# Altium schematic symbol library jlcpcb_2025_04_inductors_extended_0402.schlib: 1396 symbols (part 2 of 8) (continued)
## HBLS1005-R12J
designator L?  Inductance: 120nH
Inductor, 120nH, ±5%, 2.8Ω, 150mA, SMD 0402; Manufacturer: HYHONGYEX; Manufacturer Part Number: HBLS1005-R12J; Self-Resonant Frequency: 600MHz; Q Factor: 8@100MHz; Package Size: 0402; JLCPCB Basic Part: No; JLCPCB Part Number: C964010; Supplier 1: LCSC; Category: Inductors; Supplier Part Number 1: C964010; Tolerance: ±5%; Rated Current: 150mA; DC Resistance: 2.8Ω; RoHS: Yes; ComponentLink1Description: Datasheet; ComponentLink1URL: https://wmsc.lcsc.com/wmsc/upload/file/pdf/v2/lcsc/2012171917_HYHONGYEX-HBLS1005-R12J_C964010.pdf; ComponentLink2Description: JLCPCB Part URL; ComponentLink2URL: https://jlcpcb.com/partdetail/C964010; ComponentLink3Description: LCSC Part URL; ComponentLink3URL: https://lcsc.com/product-detail/Inductors-SMD_HYHONGYEX-HYHONGYEX-HBLS1005-R12J_C964010.html
footprint IND-0402 (0402 (1005M) Inductor)
pins: 1, 2

## HBLS1005-R15J
designator L?  Inductance: 150nH
Inductor, 150nH, ±5%, 3.2Ω, 100mA, SMD 0402; Manufacturer: HYHONGYEX; Manufacturer Part Number: HBLS1005-R15J; Self-Resonant Frequency: 550MHz; Q Factor: 8@100MHz; Package Size: 0402; JLCPCB Basic Part: No; JLCPCB Part Number: C964011; Supplier 1: LCSC; Category: Inductors; Supplier Part Number 1: C964011; Tolerance: ±5%; Rated Current: 100mA; DC Resistance: 3.2Ω; RoHS: Yes; ComponentLink1Description: Datasheet; ComponentLink1URL: https://wmsc.lcsc.com/wmsc/upload/file/pdf/v2/lcsc/2012171917_HYHONGYEX-HBLS1005-R15J_C964011.pdf; ComponentLink2Description: JLCPCB Part URL; ComponentLink2URL: https://jlcpcb.com/partdetail/C964011; ComponentLink3Description: LCSC Part URL; ComponentLink3URL: https://lcsc.com/product-detail/Inductors-SMD_HYHONGYEX-HYHONGYEX-HBLS1005-R15J_C964011.html
footprint IND-0402 (0402 (1005M) Inductor)
pins: 1, 2

## HBLS1005-R22J
designator L?  Inductance: 220nH
Inductor, 220nH, ±5%, 4Ω, 100mA, SMD 0402; Manufacturer: HYHONGYEX; Manufacturer Part Number: HBLS1005-R22J; Self-Resonant Frequency: 450MHz; Q Factor: 8@100MHz; Package Size: 0402; JLCPCB Basic Part: No; JLCPCB Part Number: C964013; Supplier 1: LCSC; Category: Inductors; Supplier Part Number 1: C964013; Tolerance: ±5%; Rated Current: 100mA; DC Resistance: 4Ω; RoHS: Yes; ComponentLink1Description: Datasheet; ComponentLink1URL: https://wmsc.lcsc.com/wmsc/upload/file/pdf/v2/lcsc/2201131330_HYHONGYEX-HBLS1005-R22J_C964013.pdf; ComponentLink2Description: JLCPCB Part URL; ComponentLink2URL: https://jlcpcb.com/partdetail/C964013; ComponentLink3Description: LCSC Part URL; ComponentLink3URL: https://lcsc.com/product-detail/Inductors-SMD_HYHONGYEX-HYHONGYEX-HBLS1005-R22J_C964013.html
footprint IND-0402 (0402 (1005M) Inductor)
pins: 1, 2

## HCI1005LF-1N5S
designator L?  Inductance: 1.5nH
Inductor, 1.5nH, 100mΩ, 300mA, SMD 0402; Manufacturer: TAI-TECH; Manufacturer Part Number: HCI1005LF-1N5S; Package Size: 0402; JLCPCB Basic Part: No; JLCPCB Part Number: C127312; Supplier 1: LCSC; Category: Inductors; Supplier Part Number 1: C127312; Rated Current: 300mA; DC Resistance: 100mΩ; RoHS: Yes; ComponentLink1Description: Datasheet; ComponentLink1URL: https://wmsc.lcsc.com/wmsc/upload/file/pdf/v2/lcsc/2009171134_TAI-TECH-HCI1005LF-1N5S_C127312.pdf; ComponentLink2Description: JLCPCB Part URL; ComponentLink2URL: https://jlcpcb.com/partdetail/C127312; ComponentLink3Description: LCSC Part URL; ComponentLink3URL: https://lcsc.com/product-detail/Inductors-SMD_TAI-TECH-TAI-TECH-HCI1005LF-1N5S_C127312.html
footprint IND-0402 (0402 (1005M) Inductor)
pins: 1, 2

## HCI1005LF-2N7S
designator L?  Inductance: 2.7nH
Inductor, 2.7nH, 200mΩ, 300mA, SMD 0402; Manufacturer: TAI-TECH; Manufacturer Part Number: HCI1005LF-2N7S; Package Size: 0402; JLCPCB Basic Part: No; JLCPCB Part Number: C127299; Supplier 1: LCSC; Category: Inductors; Supplier Part Number 1: C127299; Rated Current: 300mA; DC Resistance: 200mΩ; RoHS: Yes; ComponentLink1Description: Datasheet; ComponentLink1URL: https://wmsc.lcsc.com/wmsc/upload/file/pdf/v2/lcsc/2009171134_TAI-TECH-HCI1005LF-2N7S_C127299.pdf; ComponentLink2Description: JLCPCB Part URL; ComponentLink2URL: https://jlcpcb.com/partdetail/C127299; ComponentLink3Description: LCSC Part URL; ComponentLink3URL: https://lcsc.com/product-detail/Inductors-SMD_TAI-TECH-TAI-TECH-HCI1005LF-2N7S_C127299.html
footprint IND-0402 (0402 (1005M) Inductor)
pins: 1, 2

## HCI1005LF-4N7S
designator L?  Inductance: 4.7nH
Inductor, 4.7nH, 200mΩ, 300mA, SMD 0402; Manufacturer: TAI-TECH; Manufacturer Part Number: HCI1005LF-4N7S; Package Size: 0402; JLCPCB Basic Part: No; JLCPCB Part Number: C127297; Supplier 1: LCSC; Category: Inductors; Supplier Part Number 1: C127297; Rated Current: 300mA; DC Resistance: 200mΩ; RoHS: Yes; ComponentLink1Description: Datasheet; ComponentLink1URL: https://wmsc.lcsc.com/wmsc/upload/file/pdf/v2/lcsc/2009171134_TAI-TECH-HCI1005LF-4N7S_C127297.pdf; ComponentLink2Description: JLCPCB Part URL; ComponentLink2URL: https://jlcpcb.com/partdetail/C127297; ComponentLink3Description: LCSC Part URL; ComponentLink3URL: https://lcsc.com/product-detail/Inductors-SMD_TAI-TECH-TAI-TECH-HCI1005LF-4N7S_C127297.html
footprint IND-0402 (0402 (1005M) Inductor)
pins: 1, 2

## HCI1005LF-4N7S-MS8
designator L?  Inductance: 4.7nH
Inductor, 4.7nH, 200mΩ, 300mA, SMD 0402; Manufacturer: TAI-TECH; Manufacturer Part Number: HCI1005LF-4N7S-MS8; Package Size: 0402; JLCPCB Basic Part: No; JLCPCB Part Number: C304335; Supplier 1: LCSC; Category: Inductors; Supplier Part Number 1: C304335; Rated Current: 300mA; DC Resistance: 200mΩ; RoHS: Yes; ComponentLink1Description: Datasheet; ComponentLink1URL: https://wmsc.lcsc.com/wmsc/upload/file/pdf/v2/lcsc/2009171411_TAI-TECH-HCI1005LF-4N7S-MS8_C304335.pdf; ComponentLink2Description: JLCPCB Part URL; ComponentLink2URL: https://jlcpcb.com/partdetail/C304335; ComponentLink3Description: LCSC Part URL; ComponentLink3URL: https://lcsc.com/product-detail/Inductors-SMD_TAI-TECH-TAI-TECH-HCI1005LF-4N7S-MS8_C304335.html
footprint IND-0402 (0402 (1005M) Inductor)
pins: 1, 2

## HCI1005LF-12NJ
designator L?  Inductance: 12nH
Inductor, 12nH, ±5%, 500mΩ, 300mA, SMD 0402; Manufacturer: TAI-TECH; Manufacturer Part Number: HCI1005LF-12NJ; Package Size: 0402; JLCPCB Basic Part: No; JLCPCB Part Number: C127305; Supplier 1: LCSC; Category: Inductors; Supplier Part Number 1: C127305; Tolerance: ±5%; Rated Current: 300mA; DC Resistance: 500mΩ; RoHS: Yes; ComponentLink1Description: Datasheet; ComponentLink1URL: https://wmsc.lcsc.com/wmsc/upload/file/pdf/v2/lcsc/2009171134_TAI-TECH-HCI1005LF-12NJ_C127305.pdf; ComponentLink2Description: JLCPCB Part URL; ComponentLink2URL: https://jlcpcb.com/partdetail/C127305; ComponentLink3Description: LCSC Part URL; ComponentLink3URL: https://lcsc.com/product-detail/Inductors-SMD_TAI-TECH-TAI-TECH-HCI1005LF-12NJ_C127305.html
footprint IND-0402 (0402 (1005M) Inductor)
pins: 1, 2

## HCI1005LF-15NJ
designator L?  Inductance: 15nH
Inductor, 15nH, ±5%, 500mΩ, 300mA, SMD 0402; Manufacturer: TAI-TECH; Manufacturer Part Number: HCI1005LF-15NJ; Package Size: 0402; JLCPCB Basic Part: No; JLCPCB Part Number: C127298; Supplier 1: LCSC; Category: Inductors; Supplier Part Number 1: C127298; Tolerance: ±5%; Rated Current: 300mA; DC Resistance: 500mΩ; RoHS: Yes; ComponentLink1Description: Datasheet; ComponentLink1URL: https://wmsc.lcsc.com/wmsc/upload/file/pdf/v2/lcsc/2009171134_TAI-TECH-HCI1005LF-15NJ_C127298.pdf; ComponentLink2Description: JLCPCB Part URL; ComponentLink2URL: https://jlcpcb.com/partdetail/C127298; ComponentLink3Description: LCSC Part URL; ComponentLink3URL: https://lcsc.com/product-detail/Inductors-SMD_TAI-TECH-TAI-TECH-HCI1005LF-15NJ_C127298.html
footprint IND-0402 (0402 (1005M) Inductor)
pins: 1, 2

## HCI1005LF-39NJ
designator L?  Inductance: 39nH
Inductor, 39nH, ±5%, 1Ω, 200mA, SMD 0402; Manufacturer: TAI-TECH; Manufacturer Part Number: HCI1005LF-39NJ; Package Size: 0402; JLCPCB Basic Part: No; JLCPCB Part Number: C127304; Supplier 1: LCSC; Category: Inductors; Supplier Part Number 1: C127304; Tolerance: ±5%; Rated Current: 200mA; DC Resistance: 1Ω; RoHS: Yes; ComponentLink1Description: Datasheet; ComponentLink1URL: https://wmsc.lcsc.com/wmsc/upload/file/pdf/v2/lcsc/2009171134_TAI-TECH-HCI1005LF-39NJ_C127304.pdf; ComponentLink2Description: JLCPCB Part URL; ComponentLink2URL: https://jlcpcb.com/partdetail/C127304; ComponentLink3Description: LCSC Part URL; ComponentLink3URL: https://lcsc.com/product-detail/Inductors-SMD_TAI-TECH-TAI-TECH-HCI1005LF-39NJ_C127304.html
footprint IND-0402 (0402 (1005M) Inductor)
pins: 1, 2

## HK1005R10J-T
designator L?  Inductance: 100nH
Inductor, 100nH, ±5%, 1.5Ω, 200mA, SMD 0402; Manufacturer: Taiyo Yuden; Manufacturer Part Number: HK1005R10J-T; Q Factor: 8@100MHz; Package Size: 0402; JLCPCB Basic Part: No; JLCPCB Part Number: C87196; Supplier 1: LCSC; Category: Inductors; Supplier Part Number 1: C87196; Tolerance: ±5%; Rated Current: 200mA; DC Resistance: 1.5Ω; RoHS: Yes; ComponentLink1Description: Datasheet; ComponentLink1URL: https://wmsc.lcsc.com/wmsc/upload/file/pdf/v2/lcsc/2304140030_Taiyo-Yuden-HK1005R10J-T_C87196.pdf; ComponentLink2Description: JLCPCB Part URL; ComponentLink2URL: https://jlcpcb.com/partdetail/C87196; ComponentLink3Description: LCSC Part URL; ComponentLink3URL: https://lcsc.com/product-detail/Inductors-SMD_Taiyo-Yuden-Taiyo-Yuden-HK1005R10J-T_C87196.html
footprint IND-0402 (0402 (1005M) Inductor)
pins: 1, 2

## HK10051N5S-T
designator L?  Inductance: 1.5nH
Inductor, 1.5nH, 100mΩ, 850mA, SMD 0402; Manufacturer: Taiyo Yuden; Manufacturer Part Number: HK10051N5S-T; Self-Resonant Frequency: 100MHz; Q Factor: 8@100MHz; Package Size: 0402; JLCPCB Basic Part: No; JLCPCB Part Number: C87175; Supplier 1: LCSC; Category: Inductors; Supplier Part Number 1: C87175; Rated Current: 850mA; DC Resistance: 100mΩ; RoHS: Yes; ComponentLink1Description: Datasheet; ComponentLink1URL: https://wmsc.lcsc.com/wmsc/upload/file/pdf/v2/lcsc/2304140030_Taiyo-Yuden-HK10051N5S-T_C87175.pdf; ComponentLink2Description: JLCPCB Part URL; ComponentLink2URL: https://jlcpcb.com/partdetail/C87175; ComponentLink3Description: LCSC Part URL; ComponentLink3URL: https://lcsc.com/product-detail/Inductors-SMD_Taiyo-Yuden-Taiyo-Yuden-HK10051N5S-T_C87175.html
footprint IND-0402 (0402 (1005M) Inductor)
pins: 1, 2

## HK10053N6S-T
designator L?  Inductance: 3.6nH
Inductor, 3.6nH, 200mΩ, 500mA, SMD 0402; Manufacturer: Taiyo Yuden; Manufacturer Part Number: HK10053N6S-T; Self-Resonant Frequency: 100MHz; Q Factor: 8@100MHz; Package Size: 0402; JLCPCB Basic Part: No; JLCPCB Part Number: C89160; Supplier 1: LCSC; Category: Inductors; Supplier Part Number 1: C89160; Rated Current: 500mA; DC Resistance: 200mΩ; RoHS: Yes; ComponentLink1Description: Datasheet; ComponentLink1URL: https://wmsc.lcsc.com/wmsc/upload/file/pdf/v2/lcsc/2304140030_Taiyo-Yuden-HK10053N6S-T_C89160.pdf; ComponentLink2Description: JLCPCB Part URL; ComponentLink2URL: https://jlcpcb.com/partdetail/C89160; ComponentLink3Description: LCSC Part URL; ComponentLink3URL: https://lcsc.com/product-detail/Inductors-SMD_Taiyo-Yuden-Taiyo-Yuden-HK10053N6S-T_C89160.html
footprint IND-0402 (0402 (1005M) Inductor)
pins: 1, 2

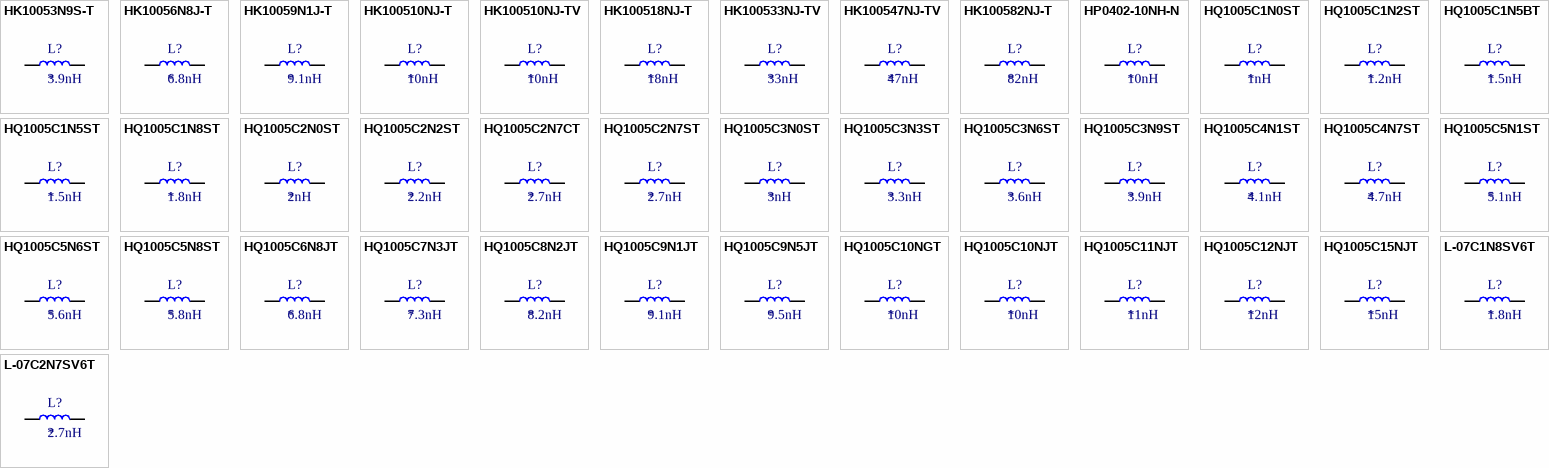
[diagram p6: symbols HK10053N9S-T to L-07C2N7SV6T]

## HK10053N9S-T
designator L?  Inductance: 3.9nH
Inductor, 3.9nH, 210mΩ, 500mA, SMD 0402; Manufacturer: Taiyo Yuden; Manufacturer Part Number: HK10053N9S-T; Package Size: 0402; JLCPCB Basic Part: No; JLCPCB Part Number: C87180; Supplier 1: LCSC; Category: Inductors; Supplier Part Number 1: C87180; Rated Current: 500mA; DC Resistance: 210mΩ; RoHS: Yes; ComponentLink1Description: Datasheet; ComponentLink1URL: https://wmsc.lcsc.com/wmsc/upload/file/pdf/v2/lcsc/2304140030_Taiyo-Yuden-HK10053N9S-T_C87180.pdf; ComponentLink2Description: JLCPCB Part URL; ComponentLink2URL: https://jlcpcb.com/partdetail/C87180; ComponentLink3Description: LCSC Part URL; ComponentLink3URL: https://lcsc.com/product-detail/Inductors-SMD_Taiyo-Yuden-Taiyo-Yuden-HK10053N9S-T_C87180.html
footprint IND-0402 (0402 (1005M) Inductor)
pins: 1, 2

## HK10056N8J-T
designator L?  Inductance: 6.8nH
Inductor, 6.8nH, ±5%, 250mΩ, 430mA, SMD 0402; Manufacturer: Taiyo Yuden; Manufacturer Part Number: HK10056N8J-T; Q Factor: 8@100MHz; Package Size: 0402; JLCPCB Basic Part: No; JLCPCB Part Number: C87184; Supplier 1: LCSC; Category: Inductors; Supplier Part Number 1: C87184; Tolerance: ±5%; Rated Current: 430mA; DC Resistance: 250mΩ; RoHS: Yes; ComponentLink1Description: Datasheet; ComponentLink1URL: https://wmsc.lcsc.com/wmsc/upload/file/pdf/v2/lcsc/2304140030_Taiyo-Yuden-HK10056N8J-T_C87184.pdf; ComponentLink2Description: JLCPCB Part URL; ComponentLink2URL: https://jlcpcb.com/partdetail/C87184; ComponentLink3Description: LCSC Part URL; ComponentLink3URL: https://lcsc.com/product-detail/Inductors-SMD_Taiyo-Yuden-Taiyo-Yuden-HK10056N8J-T_C87184.html
footprint IND-0402 (0402 (1005M) Inductor)
pins: 1, 2

## HK10059N1J-T
designator L?  Inductance: 9.1nH
Inductor, 9.1nH, ±5%, 300mΩ, 360mA, SMD 0402; Manufacturer: Taiyo Yuden; Manufacturer Part Number: HK10059N1J-T; Q Factor: 8@100MHz; Package Size: 0402; JLCPCB Basic Part: No; JLCPCB Part Number: C87186; Supplier 1: LCSC; Category: Inductors; Supplier Part Number 1: C87186; Tolerance: ±5%; Rated Current: 360mA; DC Resistance: 300mΩ; RoHS: Yes; ComponentLink1Description: Datasheet; ComponentLink1URL: https://wmsc.lcsc.com/wmsc/upload/file/pdf/v2/lcsc/2304140030_Taiyo-Yuden-HK10059N1J-T_C87186.pdf; ComponentLink2Description: JLCPCB Part URL; ComponentLink2URL: https://jlcpcb.com/partdetail/C87186; ComponentLink3Description: LCSC Part URL; ComponentLink3URL: https://lcsc.com/product-detail/Inductors-SMD_Taiyo-Yuden-Taiyo-Yuden-HK10059N1J-T_C87186.html
footprint IND-0402 (0402 (1005M) Inductor)
pins: 1, 2

## HK100510NJ-T
designator L?  Inductance: 10nH
Inductor, 10nH, ±5%, 310mΩ, 340mA, SMD 0402; Manufacturer: Taiyo Yuden; Manufacturer Part Number: HK100510NJ-T; Q Factor: 8@100MHz; Package Size: 0402; JLCPCB Basic Part: No; JLCPCB Part Number: C87187; Supplier 1: LCSC; Category: Inductors; Supplier Part Number 1: C87187; Tolerance: ±5%; Rated Current: 340mA; DC Resistance: 310mΩ; RoHS: Yes; ComponentLink1Description: Datasheet; ComponentLink1URL: https://wmsc.lcsc.com/wmsc/upload/file/pdf/v2/lcsc/2304140030_Taiyo-Yuden-HK100510NJ-T_C87187.pdf; ComponentLink2Description: JLCPCB Part URL; ComponentLink2URL: https://jlcpcb.com/partdetail/C87187; ComponentLink3Description: LCSC Part URL; ComponentLink3URL: https://lcsc.com/product-detail/Inductors-SMD_Taiyo-Yuden-Taiyo-Yuden-HK100510NJ-T_C87187.html
footprint IND-0402 (0402 (1005M) Inductor)
pins: 1, 2

## HK100510NJ-TV
designator L?  Inductance: 10nH
Inductor, 10nH, ±5%, 310mΩ, 300mA, SMD 0402; Manufacturer: Taiyo Yuden; Manufacturer Part Number: HK100510NJ-TV; Self-Resonant Frequency: 3.2GHz; Q Factor: 8@100MHz; Package Size: 0402; JLCPCB Basic Part: No; JLCPCB Part Number: C2046086; Supplier 1: LCSC; Category: Inductors; Supplier Part Number 1: C2046086; Tolerance: ±5%; Rated Current: 300mA; DC Resistance: 310mΩ; RoHS: Yes; ComponentLink1Description: Datasheet; ComponentLink1URL: https://wmsc.lcsc.com/wmsc/upload/file/pdf/v2/lcsc/2404231147_Taiyo-Yuden-HK100510NJ-TV_C2046086.pdf; ComponentLink2Description: JLCPCB Part URL; ComponentLink2URL: https://jlcpcb.com/partdetail/C2046086; ComponentLink3Description: LCSC Part URL; ComponentLink3URL: https://lcsc.com/product-detail/Inductors-SMD_Taiyo-Yuden-Taiyo-Yuden-HK100510NJ-TV_C2046086.html
footprint IND-0402 (0402 (1005M) Inductor)
pins: 1, 2

## HK100518NJ-T
designator L?  Inductance: 18nH
Inductor, 18nH, ±5%, 550mΩ, 310mA, SMD 0402; Manufacturer: Taiyo Yuden; Manufacturer Part Number: HK100518NJ-T; Q Factor: 8@100MHz; Package Size: 0402; JLCPCB Basic Part: No; JLCPCB Part Number: C87190; Supplier 1: LCSC; Category: Inductors; Supplier Part Number 1: C87190; Tolerance: ±5%; Rated Current: 310mA; DC Resistance: 550mΩ; RoHS: Yes; ComponentLink1Description: Datasheet; ComponentLink1URL: https://wmsc.lcsc.com/wmsc/upload/file/pdf/v2/lcsc/2304140030_Taiyo-Yuden-HK100518NJ-T_C87190.pdf; ComponentLink2Description: JLCPCB Part URL; ComponentLink2URL: https://jlcpcb.com/partdetail/C87190; ComponentLink3Description: LCSC Part URL; ComponentLink3URL: https://lcsc.com/product-detail/Inductors-SMD_Taiyo-Yuden-Taiyo-Yuden-HK100518NJ-T_C87190.html
footprint IND-0402 (0402 (1005M) Inductor)
pins: 1, 2

## HK100533NJ-TV
designator L?  Inductance: 33nH
Inductor, 33nH, ±5%, 500mΩ, 200mA, SMD 0402; Manufacturer: Taiyo Yuden; Manufacturer Part Number: HK100533NJ-TV; Self-Resonant Frequency: 1.3GHz; Q Factor: 8@100MHz; Package Size: 0402; JLCPCB Basic Part: No; JLCPCB Part Number: C515379; Supplier 1: LCSC; Category: Inductors; Supplier Part Number 1: C515379; Tolerance: ±5%; Rated Current: 200mA; DC Resistance: 500mΩ; RoHS: Yes; ComponentLink1Description: Datasheet; ComponentLink1URL: https://wmsc.lcsc.com/wmsc/upload/file/pdf/v2/lcsc/2304140030_Taiyo-Yuden-HK100533NJ-TV_C515379.pdf; ComponentLink2Description: JLCPCB Part URL; ComponentLink2URL: https://jlcpcb.com/partdetail/C515379; ComponentLink3Description: LCSC Part URL; ComponentLink3URL: https://lcsc.com/product-detail/Inductors-SMD_Taiyo-Yuden-Taiyo-Yuden-HK100533NJ-TV_C515379.html
footprint IND-0402 (0402 (1005M) Inductor)
pins: 1, 2

## HK100547NJ-TV
designator L?  Inductance: 47nH
Inductor, 47nH, ±5%, 580mΩ, 200mA, SMD 0402; Manufacturer: Taiyo Yuden; Manufacturer Part Number: HK100547NJ-TV; Self-Resonant Frequency: 1GHz; Q Factor: 8@100MHz; Package Size: 0402; JLCPCB Basic Part: No; JLCPCB Part Number: C515373; Supplier 1: LCSC; Category: Inductors; Supplier Part Number 1: C515373; Tolerance: ±5%; Rated Current: 200mA; DC Resistance: 580mΩ; RoHS: Yes; ComponentLink1Description: Datasheet; ComponentLink1URL: https://wmsc.lcsc.com/wmsc/upload/file/pdf/v2/lcsc/2304140030_Taiyo-Yuden-HK100547NJ-TV_C515373.pdf; ComponentLink2Description: JLCPCB Part URL; ComponentLink2URL: https://jlcpcb.com/partdetail/C515373; ComponentLink3Description: LCSC Part URL; ComponentLink3URL: https://lcsc.com/product-detail/Inductors-SMD_Taiyo-Yuden-Taiyo-Yuden-HK100547NJ-TV_C515373.html
footprint IND-0402 (0402 (1005M) Inductor)
pins: 1, 2

## HK100582NJ-T
designator L?  Inductance: 82nH
Inductor, 82nH, ±5%, 1.3Ω, 200mA, SMD 0402; Manufacturer: Taiyo Yuden; Manufacturer Part Number: HK100582NJ-T; Q Factor: 8@100MHz; Package Size: 0402; JLCPCB Basic Part: No; JLCPCB Part Number: C89165; Supplier 1: LCSC; Category: Inductors; Supplier Part Number 1: C89165; Tolerance: ±5%; Rated Current: 200mA; DC Resistance: 1.3Ω; RoHS: Yes; ComponentLink1Description: Datasheet; ComponentLink1URL: https://wmsc.lcsc.com/wmsc/upload/file/pdf/v2/lcsc/2304140030_Taiyo-Yuden-HK100582NJ-T_C89165.pdf; ComponentLink2Description: JLCPCB Part URL; ComponentLink2URL: https://jlcpcb.com/partdetail/C89165; ComponentLink3Description: LCSC Part URL; ComponentLink3URL: https://lcsc.com/product-detail/Inductors-SMD_Taiyo-Yuden-Taiyo-Yuden-HK100582NJ-T_C89165.html
footprint IND-0402 (0402 (1005M) Inductor)
pins: 1, 2

## HP0402-10NH-N
designator L?  Inductance: 10nH
Inductor, 10nH, ±3%, SMD 0402; Manufacturer: Chilisin Elec; Manufacturer Part Number: HP0402-10NH-N; Package Size: 0402; JLCPCB Basic Part: No; JLCPCB Part Number: C285911; Supplier 1: LCSC; Category: Inductors; Supplier Part Number 1: C285911; Tolerance: ±3%; RoHS: Yes; ComponentLink1Description: Datasheet; ComponentLink1URL: https://wmsc.lcsc.com/wmsc/upload/file/pdf/v2/lcsc/2304140030_Chilisin-Elec-HP0402-10NH-N_C285911.pdf; ComponentLink2Description: JLCPCB Part URL; ComponentLink2URL: https://jlcpcb.com/partdetail/C285911; ComponentLink3Description: LCSC Part URL; ComponentLink3URL: https://lcsc.com/product-detail/Inductors-SMD_Chilisin-Elec-Chilisin-Elec-HP0402-10NH-N_C285911.html
footprint IND-0402 (0402 (1005M) Inductor)
pins: 1, 2

## HQ1005C1N0ST
designator L?  Inductance: 1nH
Inductor, 1nH, 50mΩ, 1A, SMD 0402; Manufacturer: Sunlord; Manufacturer Part Number: HQ1005C1N0ST; Package Size: 0402; JLCPCB Basic Part: No; JLCPCB Part Number: C145019; Supplier 1: LCSC; Category: Inductors; Supplier Part Number 1: C145019; Rated Current: 1A; DC Resistance: 50mΩ; RoHS: Yes; ComponentLink1Description: Datasheet; ComponentLink1URL: https://wmsc.lcsc.com/wmsc/upload/file/pdf/v2/lcsc/2110081330_Sunlord-HQ1005C1N0ST_C145019.pdf; ComponentLink2Description: JLCPCB Part URL; ComponentLink2URL: https://jlcpcb.com/partdetail/C145019; ComponentLink3Description: LCSC Part URL; ComponentLink3URL: https://lcsc.com/product-detail/Inductors-SMD_Sunlord-Sunlord-HQ1005C1N0ST_C145019.html
footprint IND-0402 (0402 (1005M) Inductor)
pins: 1, 2

## HQ1005C1N2ST
designator L?  Inductance: 1.2nH
Inductor, 1.2nH, 50mΩ, 1A, SMD 0402; Manufacturer: Sunlord; Manufacturer Part Number: HQ1005C1N2ST; Package Size: 0402; JLCPCB Basic Part: No; JLCPCB Part Number: C145020; Supplier 1: LCSC; Category: Inductors; Supplier Part Number 1: C145020; Rated Current: 1A; DC Resistance: 50mΩ; RoHS: Yes; ComponentLink1Description: Datasheet; ComponentLink1URL: https://wmsc.lcsc.com/wmsc/upload/file/pdf/v2/lcsc/2110081330_Sunlord-HQ1005C1N2ST_C145020.pdf; ComponentLink2Description: JLCPCB Part URL; ComponentLink2URL: https://jlcpcb.com/partdetail/C145020; ComponentLink3Description: LCSC Part URL; ComponentLink3URL: https://lcsc.com/product-detail/Inductors-SMD_Sunlord-Sunlord-HQ1005C1N2ST_C145020.html
footprint IND-0402 (0402 (1005M) Inductor)
pins: 1, 2

## HQ1005C1N5BT
designator L?  Inductance: 1.5nH
Inductor, 1.5nH, SMD 0402; Manufacturer: Sunlord; Manufacturer Part Number: HQ1005C1N5BT; Package Size: 0402; JLCPCB Basic Part: No; JLCPCB Part Number: C2988087; Supplier 1: LCSC; Category: Inductors; Supplier Part Number 1: C2988087; RoHS: Yes; ComponentLink1Description: Datasheet; ComponentLink1URL: https://wmsc.lcsc.com/wmsc/upload/file/pdf/v2/lcsc/2203311630_Sunlord-HQ1005C1N5BT_C2988087.pdf; ComponentLink2Description: JLCPCB Part URL; ComponentLink2URL: https://jlcpcb.com/partdetail/C2988087; ComponentLink3Description: LCSC Part URL; ComponentLink3URL: https://lcsc.com/product-detail/Inductors-SMD_Sunlord-Sunlord-HQ1005C1N5BT_C2988087.html
footprint IND-0402 (0402 (1005M) Inductor)
pins: 1, 2

## HQ1005C1N5ST
designator L?  Inductance: 1.5nH
Inductor, 1.5nH, 50mΩ, 1A, SMD 0402; Manufacturer: Sunlord; Manufacturer Part Number: HQ1005C1N5ST; Package Size: 0402; JLCPCB Basic Part: No; JLCPCB Part Number: C145021; Supplier 1: LCSC; Category: Inductors; Supplier Part Number 1: C145021; Rated Current: 1A; DC Resistance: 50mΩ; RoHS: Yes; ComponentLink1Description: Datasheet; ComponentLink1URL: https://wmsc.lcsc.com/wmsc/upload/file/pdf/v2/lcsc/2110081330_Sunlord-HQ1005C1N5ST_C145021.pdf; ComponentLink2Description: JLCPCB Part URL; ComponentLink2URL: https://jlcpcb.com/partdetail/C145021; ComponentLink3Description: LCSC Part URL; ComponentLink3URL: https://lcsc.com/product-detail/Inductors-SMD_Sunlord-Sunlord-HQ1005C1N5ST_C145021.html
footprint IND-0402 (0402 (1005M) Inductor)
pins: 1, 2

## HQ1005C1N8ST
designator L?  Inductance: 1.8nH
Inductor, 1.8nH, 70mΩ, 800mA, SMD 0402; Manufacturer: Sunlord; Manufacturer Part Number: HQ1005C1N8ST; Package Size: 0402; JLCPCB Basic Part: No; JLCPCB Part Number: C145022; Supplier 1: LCSC; Category: Inductors; Supplier Part Number 1: C145022; Rated Current: 800mA; DC Resistance: 70mΩ; RoHS: Yes; ComponentLink1Description: Datasheet; ComponentLink1URL: https://wmsc.lcsc.com/wmsc/upload/file/pdf/v2/lcsc/2110081330_Sunlord-HQ1005C1N8ST_C145022.pdf; ComponentLink2Description: JLCPCB Part URL; ComponentLink2URL: https://jlcpcb.com/partdetail/C145022; ComponentLink3Description: LCSC Part URL; ComponentLink3URL: https://lcsc.com/product-detail/Inductors-SMD_Sunlord-Sunlord-HQ1005C1N8ST_C145022.html
footprint IND-0402 (0402 (1005M) Inductor)
pins: 1, 2

## HQ1005C2N0ST
designator L?  Inductance: 2nH
Inductor, 2nH, 70mΩ, 800mA, SMD 0402; Manufacturer: Sunlord; Manufacturer Part Number: HQ1005C2N0ST; Package Size: 0402; JLCPCB Basic Part: No; JLCPCB Part Number: C145023; Supplier 1: LCSC; Category: Inductors; Supplier Part Number 1: C145023; Rated Current: 800mA; DC Resistance: 70mΩ; RoHS: Yes; ComponentLink1Description: Datasheet; ComponentLink1URL: https://wmsc.lcsc.com/wmsc/upload/file/pdf/v2/lcsc/2110081330_Sunlord-HQ1005C2N0ST_C145023.pdf; ComponentLink2Description: JLCPCB Part URL; ComponentLink2URL: https://jlcpcb.com/partdetail/C145023; ComponentLink3Description: LCSC Part URL; ComponentLink3URL: https://lcsc.com/product-detail/Inductors-SMD_Sunlord-Sunlord-HQ1005C2N0ST_C145023.html
footprint IND-0402 (0402 (1005M) Inductor)
pins: 1, 2

## HQ1005C2N2ST
designator L?  Inductance: 2.2nH
Inductor, 2.2nH, 70mΩ, 800mA, SMD 0402; Manufacturer: Sunlord; Manufacturer Part Number: HQ1005C2N2ST; Package Size: 0402; JLCPCB Basic Part: No; JLCPCB Part Number: C145024; Supplier 1: LCSC; Category: Inductors; Supplier Part Number 1: C145024; Rated Current: 800mA; DC Resistance: 70mΩ; RoHS: Yes; ComponentLink1Description: Datasheet; ComponentLink1URL: https://wmsc.lcsc.com/wmsc/upload/file/pdf/v2/lcsc/2110081330_Sunlord-HQ1005C2N2ST_C145024.pdf; ComponentLink2Description: JLCPCB Part URL; ComponentLink2URL: https://jlcpcb.com/partdetail/C145024; ComponentLink3Description: LCSC Part URL; ComponentLink3URL: https://lcsc.com/product-detail/Inductors-SMD_Sunlord-Sunlord-HQ1005C2N2ST_C145024.html
footprint IND-0402 (0402 (1005M) Inductor)
pins: 1, 2

## HQ1005C2N7CT
designator L?  Inductance: 2.7nH
Inductor, 2.7nH, 90mΩ, 700mA, SMD 0402; Manufacturer: Sunlord; Manufacturer Part Number: HQ1005C2N7CT; Package Size: 0402; JLCPCB Basic Part: No; JLCPCB Part Number: C43370; Supplier 1: LCSC; Category: Inductors; Supplier Part Number 1: C43370; Rated Current: 700mA; DC Resistance: 90mΩ; RoHS: Yes; ComponentLink1Description: Datasheet; ComponentLink1URL: https://wmsc.lcsc.com/wmsc/upload/file/pdf/v2/lcsc/2110081230_Sunlord-HQ1005C2N7CT_C43370.pdf; ComponentLink2Description: JLCPCB Part URL; ComponentLink2URL: https://jlcpcb.com/partdetail/C43370; ComponentLink3Description: LCSC Part URL; ComponentLink3URL: https://lcsc.com/product-detail/Inductors-SMD_Sunlord-Sunlord-HQ1005C2N7CT_C43370.html
footprint IND-0402 (0402 (1005M) Inductor)
pins: 1, 2

## HQ1005C2N7ST
designator L?  Inductance: 2.7nH
Inductor, 2.7nH, 90mΩ, 700mA, SMD 0402; Manufacturer: Sunlord; Manufacturer Part Number: HQ1005C2N7ST; Package Size: 0402; JLCPCB Basic Part: No; JLCPCB Part Number: C145027; Supplier 1: LCSC; Category: Inductors; Supplier Part Number 1: C145027; Rated Current: 700mA; DC Resistance: 90mΩ; RoHS: Yes; ComponentLink1Description: Datasheet; ComponentLink1URL: https://wmsc.lcsc.com/wmsc/upload/file/pdf/v2/lcsc/2110081330_Sunlord-HQ1005C2N7ST_C145027.pdf; ComponentLink2Description: JLCPCB Part URL; ComponentLink2URL: https://jlcpcb.com/partdetail/C145027; ComponentLink3Description: LCSC Part URL; ComponentLink3URL: https://lcsc.com/product-detail/Inductors-SMD_Sunlord-Sunlord-HQ1005C2N7ST_C145027.html
footprint IND-0402 (0402 (1005M) Inductor)
pins: 1, 2

## HQ1005C3N0ST
designator L?  Inductance: 3nH
Inductor, 3nH, 90mΩ, 700mA, SMD 0402; Manufacturer: Sunlord; Manufacturer Part Number: HQ1005C3N0ST; Package Size: 0402; JLCPCB Basic Part: No; JLCPCB Part Number: C145029; Supplier 1: LCSC; Category: Inductors; Supplier Part Number 1: C145029; Rated Current: 700mA; DC Resistance: 90mΩ; RoHS: Yes; ComponentLink1Description: Datasheet; ComponentLink1URL: https://wmsc.lcsc.com/wmsc/upload/file/pdf/v2/lcsc/2110081330_Sunlord-HQ1005C3N0ST_C145029.pdf; ComponentLink2Description: JLCPCB Part URL; ComponentLink2URL: https://jlcpcb.com/partdetail/C145029; ComponentLink3Description: LCSC Part URL; ComponentLink3URL: https://lcsc.com/product-detail/Inductors-SMD_Sunlord-Sunlord-HQ1005C3N0ST_C145029.html
footprint IND-0402 (0402 (1005M) Inductor)
pins: 1, 2

## HQ1005C3N3ST
designator L?  Inductance: 3.3nH
Inductor, 3.3nH, 90mΩ, 700mA, SMD 0402; Manufacturer: Sunlord; Manufacturer Part Number: HQ1005C3N3ST; Package Size: 0402; JLCPCB Basic Part: No; JLCPCB Part Number: C145030; Supplier 1: LCSC; Category: Inductors; Supplier Part Number 1: C145030; Rated Current: 700mA; DC Resistance: 90mΩ; RoHS: Yes; ComponentLink1Description: Datasheet; ComponentLink1URL: https://wmsc.lcsc.com/wmsc/upload/file/pdf/v2/lcsc/2110081330_Sunlord-HQ1005C3N3ST_C145030.pdf; ComponentLink2Description: JLCPCB Part URL; ComponentLink2URL: https://jlcpcb.com/partdetail/C145030; ComponentLink3Description: LCSC Part URL; ComponentLink3URL: https://lcsc.com/product-detail/Inductors-SMD_Sunlord-Sunlord-HQ1005C3N3ST_C145030.html
footprint IND-0402 (0402 (1005M) Inductor)
pins: 1, 2

## HQ1005C3N6ST
designator L?  Inductance: 3.6nH
Inductor, 3.6nH, 100mΩ, 700mA, SMD 0402; Manufacturer: Sunlord; Manufacturer Part Number: HQ1005C3N6ST; Package Size: 0402; JLCPCB Basic Part: No; JLCPCB Part Number: C145031; Supplier 1: LCSC; Category: Inductors; Supplier Part Number 1: C145031; Rated Current: 700mA; DC Resistance: 100mΩ; RoHS: Yes; ComponentLink1Description: Datasheet; ComponentLink1URL: https://wmsc.lcsc.com/wmsc/upload/file/pdf/v2/lcsc/2110081330_Sunlord-HQ1005C3N6ST_C145031.pdf; ComponentLink2Description: JLCPCB Part URL; ComponentLink2URL: https://jlcpcb.com/partdetail/C145031; ComponentLink3Description: LCSC Part URL; ComponentLink3URL: https://lcsc.com/product-detail/Inductors-SMD_Sunlord-Sunlord-HQ1005C3N6ST_C145031.html
footprint IND-0402 (0402 (1005M) Inductor)
pins: 1, 2

## HQ1005C3N9ST
designator L?  Inductance: 3.9nH
Inductor, 3.9nH, 100mΩ, 700mA, SMD 0402; Manufacturer: Sunlord; Manufacturer Part Number: HQ1005C3N9ST; Package Size: 0402; JLCPCB Basic Part: No; JLCPCB Part Number: C145032; Supplier 1: LCSC; Category: Inductors; Supplier Part Number 1: C145032; Rated Current: 700mA; DC Resistance: 100mΩ; RoHS: Yes; ComponentLink1Description: Datasheet; ComponentLink1URL: https://wmsc.lcsc.com/wmsc/upload/file/pdf/v2/lcsc/2110081330_Sunlord-HQ1005C3N9ST_C145032.pdf; ComponentLink2Description: JLCPCB Part URL; ComponentLink2URL: https://jlcpcb.com/partdetail/C145032; ComponentLink3Description: LCSC Part URL; ComponentLink3URL: https://lcsc.com/product-detail/Inductors-SMD_Sunlord-Sunlord-HQ1005C3N9ST_C145032.html
footprint IND-0402 (0402 (1005M) Inductor)
pins: 1, 2

## HQ1005C4N1ST
designator L?  Inductance: 4.1nH
Inductor, 4.1nH, 120mΩ, 650mA, SMD 0402; Manufacturer: Sunlord; Manufacturer Part Number: HQ1005C4N1ST; Package Size: 0402; JLCPCB Basic Part: No; JLCPCB Part Number: C145033; Supplier 1: LCSC; Category: Inductors; Supplier Part Number 1: C145033; Rated Current: 650mA; DC Resistance: 120mΩ; RoHS: Yes; ComponentLink1Description: Datasheet; ComponentLink1URL: https://wmsc.lcsc.com/wmsc/upload/file/pdf/v2/lcsc/2110081330_Sunlord-HQ1005C4N1ST_C145033.pdf; ComponentLink2Description: JLCPCB Part URL; ComponentLink2URL: https://jlcpcb.com/partdetail/C145033; ComponentLink3Description: LCSC Part URL; ComponentLink3URL: https://lcsc.com/product-detail/Inductors-SMD_Sunlord-Sunlord-HQ1005C4N1ST_C145033.html
footprint IND-0402 (0402 (1005M) Inductor)
pins: 1, 2

## HQ1005C4N7ST
designator L?  Inductance: 4.7nH
Inductor, 4.7nH, 130mΩ, 600mA, SMD 0402; Manufacturer: Sunlord; Manufacturer Part Number: HQ1005C4N7ST; Package Size: 0402; JLCPCB Basic Part: No; JLCPCB Part Number: C145035; Supplier 1: LCSC; Category: Inductors; Supplier Part Number 1: C145035; Rated Current: 600mA; DC Resistance: 130mΩ; RoHS: Yes; ComponentLink1Description: Datasheet; ComponentLink1URL: https://wmsc.lcsc.com/wmsc/upload/file/pdf/v2/lcsc/2110081330_Sunlord-HQ1005C4N7ST_C145035.pdf; ComponentLink2Description: JLCPCB Part URL; ComponentLink2URL: https://jlcpcb.com/partdetail/C145035; ComponentLink3Description: LCSC Part URL; ComponentLink3URL: https://lcsc.com/product-detail/Inductors-SMD_Sunlord-Sunlord-HQ1005C4N7ST_C145035.html
footprint IND-0402 (0402 (1005M) Inductor)
pins: 1, 2

## HQ1005C5N1ST
designator L?  Inductance: 5.1nH
Inductor, 5.1nH, 130mΩ, 600mA, SMD 0402; Manufacturer: Sunlord; Manufacturer Part Number: HQ1005C5N1ST; Package Size: 0402; JLCPCB Basic Part: No; JLCPCB Part Number: C145036; Supplier 1: LCSC; Category: Inductors; Supplier Part Number 1: C145036; Rated Current: 600mA; DC Resistance: 130mΩ; RoHS: Yes; ComponentLink1Description: Datasheet; ComponentLink1URL: https://wmsc.lcsc.com/wmsc/upload/file/pdf/v2/lcsc/2110081330_Sunlord-HQ1005C5N1ST_C145036.pdf; ComponentLink2Description: JLCPCB Part URL; ComponentLink2URL: https://jlcpcb.com/partdetail/C145036; ComponentLink3Description: LCSC Part URL; ComponentLink3URL: https://lcsc.com/product-detail/Inductors-SMD_Sunlord-Sunlord-HQ1005C5N1ST_C145036.html
footprint IND-0402 (0402 (1005M) Inductor)
pins: 1, 2

## HQ1005C5N6ST
designator L?  Inductance: 5.6nH
Inductor, 5.6nH, 130mΩ, 600mA, SMD 0402; Manufacturer: Sunlord; Manufacturer Part Number: HQ1005C5N6ST; Package Size: 0402; JLCPCB Basic Part: No; JLCPCB Part Number: C145037; Supplier 1: LCSC; Category: Inductors; Supplier Part Number 1: C145037; Rated Current: 600mA; DC Resistance: 130mΩ; RoHS: Yes; ComponentLink1Description: Datasheet; ComponentLink1URL: https://wmsc.lcsc.com/wmsc/upload/file/pdf/v2/lcsc/2110081330_Sunlord-HQ1005C5N6ST_C145037.pdf; ComponentLink2Description: JLCPCB Part URL; ComponentLink2URL: https://jlcpcb.com/partdetail/C145037; ComponentLink3Description: LCSC Part URL; ComponentLink3URL: https://lcsc.com/product-detail/Inductors-SMD_Sunlord-Sunlord-HQ1005C5N6ST_C145037.html
footprint IND-0402 (0402 (1005M) Inductor)
pins: 1, 2

## HQ1005C5N8ST
designator L?  Inductance: 5.8nH
Inductor, 5.8nH, 130mΩ, 600mA, SMD 0402; Manufacturer: Sunlord; Manufacturer Part Number: HQ1005C5N8ST; Package Size: 0402; JLCPCB Basic Part: No; JLCPCB Part Number: C145038; Supplier 1: LCSC; Category: Inductors; Supplier Part Number 1: C145038; Rated Current: 600mA; DC Resistance: 130mΩ; RoHS: Yes; ComponentLink1Description: Datasheet; ComponentLink1URL: https://wmsc.lcsc.com/wmsc/upload/file/pdf/v2/lcsc/2110081330_Sunlord-HQ1005C5N8ST_C145038.pdf; ComponentLink2Description: JLCPCB Part URL; ComponentLink2URL: https://jlcpcb.com/partdetail/C145038; ComponentLink3Description: LCSC Part URL; ComponentLink3URL: https://lcsc.com/product-detail/Inductors-SMD_Sunlord-Sunlord-HQ1005C5N8ST_C145038.html
footprint IND-0402 (0402 (1005M) Inductor)
pins: 1, 2

## HQ1005C6N8JT
designator L?  Inductance: 6.8nH
Inductor, 6.8nH, ±5%, 150mΩ, 550mA, SMD 0402; Manufacturer: Sunlord; Manufacturer Part Number: HQ1005C6N8JT; Package Size: 0402; JLCPCB Basic Part: No; JLCPCB Part Number: C145040; Supplier 1: LCSC; Category: Inductors; Supplier Part Number 1: C145040; Tolerance: ±5%; Rated Current: 550mA; DC Resistance: 150mΩ; RoHS: Yes; ComponentLink1Description: Datasheet; ComponentLink1URL: https://wmsc.lcsc.com/wmsc/upload/file/pdf/v2/lcsc/2110081330_Sunlord-HQ1005C6N8JT_C145040.pdf; ComponentLink2Description: JLCPCB Part URL; ComponentLink2URL: https://jlcpcb.com/partdetail/C145040; ComponentLink3Description: LCSC Part URL; ComponentLink3URL: https://lcsc.com/product-detail/Inductors-SMD_Sunlord-Sunlord-HQ1005C6N8JT_C145040.html
footprint IND-0402 (0402 (1005M) Inductor)
pins: 1, 2

## HQ1005C7N3JT
designator L?  Inductance: 7.3nH
Inductor, 7.3nH, ±5%, 160mΩ, 550mA, SMD 0402; Manufacturer: Sunlord; Manufacturer Part Number: HQ1005C7N3JT; Package Size: 0402; JLCPCB Basic Part: No; JLCPCB Part Number: C145041; Supplier 1: LCSC; Category: Inductors; Supplier Part Number 1: C145041; Tolerance: ±5%; Rated Current: 550mA; DC Resistance: 160mΩ; RoHS: Yes; ComponentLink1Description: Datasheet; ComponentLink1URL: https://wmsc.lcsc.com/wmsc/upload/file/pdf/v2/lcsc/2110081330_Sunlord-HQ1005C7N3JT_C145041.pdf; ComponentLink2Description: JLCPCB Part URL; ComponentLink2URL: https://jlcpcb.com/partdetail/C145041; ComponentLink3Description: LCSC Part URL; ComponentLink3URL: https://lcsc.com/product-detail/Inductors-SMD_Sunlord-Sunlord-HQ1005C7N3JT_C145041.html
footprint IND-0402 (0402 (1005M) Inductor)
pins: 1, 2

## HQ1005C8N2JT
designator L?  Inductance: 8.2nH
Inductor, 8.2nH, ±5%, 160mΩ, 550mA, SMD 0402; Manufacturer: Sunlord; Manufacturer Part Number: HQ1005C8N2JT; Package Size: 0402; JLCPCB Basic Part: No; JLCPCB Part Number: C145043; Supplier 1: LCSC; Category: Inductors; Supplier Part Number 1: C145043; Tolerance: ±5%; Rated Current: 550mA; DC Resistance: 160mΩ; RoHS: Yes; ComponentLink1Description: Datasheet; ComponentLink1URL: https://wmsc.lcsc.com/wmsc/upload/file/pdf/v2/lcsc/2110081330_Sunlord-HQ1005C8N2JT_C145043.pdf; ComponentLink2Description: JLCPCB Part URL; ComponentLink2URL: https://jlcpcb.com/partdetail/C145043; ComponentLink3Description: LCSC Part URL; ComponentLink3URL: https://lcsc.com/product-detail/Inductors-SMD_Sunlord-Sunlord-HQ1005C8N2JT_C145043.html
footprint IND-0402 (0402 (1005M) Inductor)
pins: 1, 2

## HQ1005C9N1JT
designator L?  Inductance: 9.1nH
Inductor, 9.1nH, ±5%, 180mΩ, 500mA, SMD 0402; Manufacturer: Sunlord; Manufacturer Part Number: HQ1005C9N1JT; Package Size: 0402; JLCPCB Basic Part: No; JLCPCB Part Number: C145045; Supplier 1: LCSC; Category: Inductors; Supplier Part Number 1: C145045; Tolerance: ±5%; Rated Current: 500mA; DC Resistance: 180mΩ; RoHS: Yes; ComponentLink1Description: Datasheet; ComponentLink1URL: https://wmsc.lcsc.com/wmsc/upload/file/pdf/v2/lcsc/2110081330_Sunlord-HQ1005C9N1JT_C145045.pdf; ComponentLink2Description: JLCPCB Part URL; ComponentLink2URL: https://jlcpcb.com/partdetail/C145045; ComponentLink3Description: LCSC Part URL; ComponentLink3URL: https://lcsc.com/product-detail/Inductors-SMD_Sunlord-Sunlord-HQ1005C9N1JT_C145045.html
footprint IND-0402 (0402 (1005M) Inductor)
pins: 1, 2

## HQ1005C9N5JT
designator L?  Inductance: 9.5nH
Inductor, 9.5nH, ±5%, 180mΩ, 500mA, SMD 0402; Manufacturer: Sunlord; Manufacturer Part Number: HQ1005C9N5JT; Package Size: 0402; JLCPCB Basic Part: No; JLCPCB Part Number: C145046; Supplier 1: LCSC; Category: Inductors; Supplier Part Number 1: C145046; Tolerance: ±5%; Rated Current: 500mA; DC Resistance: 180mΩ; RoHS: Yes; ComponentLink1Description: Datasheet; ComponentLink1URL: https://wmsc.lcsc.com/wmsc/upload/file/pdf/v2/lcsc/2110081330_Sunlord-HQ1005C9N5JT_C145046.pdf; ComponentLink2Description: JLCPCB Part URL; ComponentLink2URL: https://jlcpcb.com/partdetail/C145046; ComponentLink3Description: LCSC Part URL; ComponentLink3URL: https://lcsc.com/product-detail/Inductors-SMD_Sunlord-Sunlord-HQ1005C9N5JT_C145046.html
footprint IND-0402 (0402 (1005M) Inductor)
pins: 1, 2

## HQ1005C10NGT
designator L?  Inductance: 10nH
Inductor, 10nH, SMD 0402; Manufacturer: Sunlord; Manufacturer Part Number: HQ1005C10NGT; Package Size: 0402; JLCPCB Basic Part: No; JLCPCB Part Number: C2991779; Supplier 1: LCSC; Category: Inductors; Supplier Part Number 1: C2991779; RoHS: Yes; ComponentLink1Description: Datasheet; ComponentLink1URL: https://wmsc.lcsc.com/wmsc/upload/file/pdf/v2/lcsc/2204082130_Sunlord-HQ1005C10NGT_C2991779.pdf; ComponentLink2Description: JLCPCB Part URL; ComponentLink2URL: https://jlcpcb.com/partdetail/C2991779; ComponentLink3Description: LCSC Part URL; ComponentLink3URL: https://lcsc.com/product-detail/Inductors-SMD_Sunlord-Sunlord-HQ1005C10NGT_C2991779.html
footprint IND-0402 (0402 (1005M) Inductor)
pins: 1, 2

## HQ1005C10NJT
designator L?  Inductance: 10nH
Inductor, 10nH, ±5%, 180mΩ, 500mA, SMD 0402; Manufacturer: Sunlord; Manufacturer Part Number: HQ1005C10NJT; Package Size: 0402; JLCPCB Basic Part: No; JLCPCB Part Number: C145047; Supplier 1: LCSC; Category: Inductors; Supplier Part Number 1: C145047; Tolerance: ±5%; Rated Current: 500mA; DC Resistance: 180mΩ; RoHS: Yes; ComponentLink1Description: Datasheet; ComponentLink1URL: https://wmsc.lcsc.com/wmsc/upload/file/pdf/v2/lcsc/2109161530_Sunlord-HQ1005C10NJT_C145047.pdf; ComponentLink2Description: JLCPCB Part URL; ComponentLink2URL: https://jlcpcb.com/partdetail/C145047; ComponentLink3Description: LCSC Part URL; ComponentLink3URL: https://lcsc.com/product-detail/Inductors-SMD_Sunlord-Sunlord-HQ1005C10NJT_C145047.html
footprint IND-0402 (0402 (1005M) Inductor)
pins: 1, 2

## HQ1005C11NJT
designator L?  Inductance: 11nH
Inductor, 11nH, ±5%, 200mΩ, 500mA, SMD 0402; Manufacturer: Sunlord; Manufacturer Part Number: HQ1005C11NJT; Package Size: 0402; JLCPCB Basic Part: No; JLCPCB Part Number: C145048; Supplier 1: LCSC; Category: Inductors; Supplier Part Number 1: C145048; Tolerance: ±5%; Rated Current: 500mA; DC Resistance: 200mΩ; RoHS: Yes; ComponentLink1Description: Datasheet; ComponentLink1URL: https://wmsc.lcsc.com/wmsc/upload/file/pdf/v2/lcsc/2110081330_Sunlord-HQ1005C11NJT_C145048.pdf; ComponentLink2Description: JLCPCB Part URL; ComponentLink2URL: https://jlcpcb.com/partdetail/C145048; ComponentLink3Description: LCSC Part URL; ComponentLink3URL: https://lcsc.com/product-detail/Inductors-SMD_Sunlord-Sunlord-HQ1005C11NJT_C145048.html
footprint IND-0402 (0402 (1005M) Inductor)
pins: 1, 2

## HQ1005C12NJT
designator L?  Inductance: 12nH
Inductor, 12nH, ±5%, 200mΩ, 500mA, SMD 0402; Manufacturer: Sunlord; Manufacturer Part Number: HQ1005C12NJT; Package Size: 0402; JLCPCB Basic Part: No; JLCPCB Part Number: C145049; Supplier 1: LCSC; Category: Inductors; Supplier Part Number 1: C145049; Tolerance: ±5%; Rated Current: 500mA; DC Resistance: 200mΩ; RoHS: Yes; ComponentLink1Description: Datasheet; ComponentLink1URL: https://wmsc.lcsc.com/wmsc/upload/file/pdf/v2/lcsc/2110081330_Sunlord-HQ1005C12NJT_C145049.pdf; ComponentLink2Description: JLCPCB Part URL; ComponentLink2URL: https://jlcpcb.com/partdetail/C145049; ComponentLink3Description: LCSC Part URL; ComponentLink3URL: https://lcsc.com/product-detail/Inductors-SMD_Sunlord-Sunlord-HQ1005C12NJT_C145049.html
footprint IND-0402 (0402 (1005M) Inductor)
pins: 1, 2

## HQ1005C15NJT
designator L?  Inductance: 15nH
Inductor, 15nH, ±5%, 220mΩ, 430mA, SMD 0402; Manufacturer: Sunlord; Manufacturer Part Number: HQ1005C15NJT; Package Size: 0402; JLCPCB Basic Part: No; JLCPCB Part Number: C145050; Supplier 1: LCSC; Category: Inductors; Supplier Part Number 1: C145050; Tolerance: ±5%; Rated Current: 430mA; DC Resistance: 220mΩ; RoHS: Yes; ComponentLink1Description: Datasheet; ComponentLink1URL: https://wmsc.lcsc.com/wmsc/upload/file/pdf/v2/lcsc/2110081330_Sunlord-HQ1005C15NJT_C145050.pdf; ComponentLink2Description: JLCPCB Part URL; ComponentLink2URL: https://jlcpcb.com/partdetail/C145050; ComponentLink3Description: LCSC Part URL; ComponentLink3URL: https://lcsc.com/product-detail/Inductors-SMD_Sunlord-Sunlord-HQ1005C15NJT_C145050.html
footprint IND-0402 (0402 (1005M) Inductor)
pins: 1, 2

## L-07C1N8SV6T
designator L?  Inductance: 1.8nH
Inductor, 1.8nH, 140mΩ, 300mA, SMD 0402; Manufacturer: Johanson Dielectrics; Manufacturer Part Number: L-07C1N8SV6T; Self-Resonant Frequency: 21GHz; Q Factor: 8@100MHz; Package Size: 0402; JLCPCB Basic Part: No; JLCPCB Part Number: C2043552; Supplier 1: LCSC; Category: Inductors; Supplier Part Number 1: C2043552; Rated Current: 300mA; DC Resistance: 140mΩ; RoHS: Yes; ComponentLink1Description: Datasheet; ComponentLink1URL: https://wmsc.lcsc.com/wmsc/upload/file/pdf/v2/lcsc/2304140030_Johanson-Dielectrics-L-07C1N8SV6T_C2043552.pdf; ComponentLink2Description: JLCPCB Part URL; ComponentLink2URL: https://jlcpcb.com/partdetail/C2043552; ComponentLink3Description: LCSC Part URL; ComponentLink3URL: https://lcsc.com/product-detail/Inductors-SMD_Johanson-Dielectrics-Johanson-Dielectrics-L-07C1N8SV6T_C2043552.html
footprint IND-0402 (0402 (1005M) Inductor)
pins: 1, 2

## L-07C2N7SV6T
designator L?  Inductance: 2.7nH
Inductor, 2.7nH, 170mΩ, 300mA, SMD 0402; Manufacturer: Johanson Dielectrics; Manufacturer Part Number: L-07C2N7SV6T; Self-Resonant Frequency: 21GHz; Q Factor: 8@100MHz; Package Size: 0402; JLCPCB Basic Part: No; JLCPCB Part Number: C2041435; Supplier 1: LCSC; Category: Inductors; Supplier Part Number 1: C2041435; Rated Current: 300mA; DC Resistance: 170mΩ; RoHS: Yes; ComponentLink1Description: Datasheet; ComponentLink1URL: https://wmsc.lcsc.com/wmsc/upload/file/pdf/v2/lcsc/2304140030_Johanson-Dielectrics-L-07C2N7SV6T_C2041435.pdf; ComponentLink2Description: JLCPCB Part URL; ComponentLink2URL: https://jlcpcb.com/partdetail/C2041435; ComponentLink3Description: LCSC Part URL; ComponentLink3URL: https://lcsc.com/product-detail/Inductors-SMD_Johanson-Dielectrics-Johanson-Dielectrics-L-07C2N7SV6T_C2041435.html
footprint IND-0402 (0402 (1005M) Inductor)
pins: 1, 2
